# Altium footprint library CONNECTOR.PcbLib: 169 footprints (part 5 of 11)
Each footprint in its own frame and in the unit in brackets; x right, y up, seen from the top. Pads: shape width x height; smd on the part's side, far side on the other; paste and mask are expansions set on the pad; w line width, h text height; cw(c..) or ccw(c..) is an arc to the next point about the centre after c.
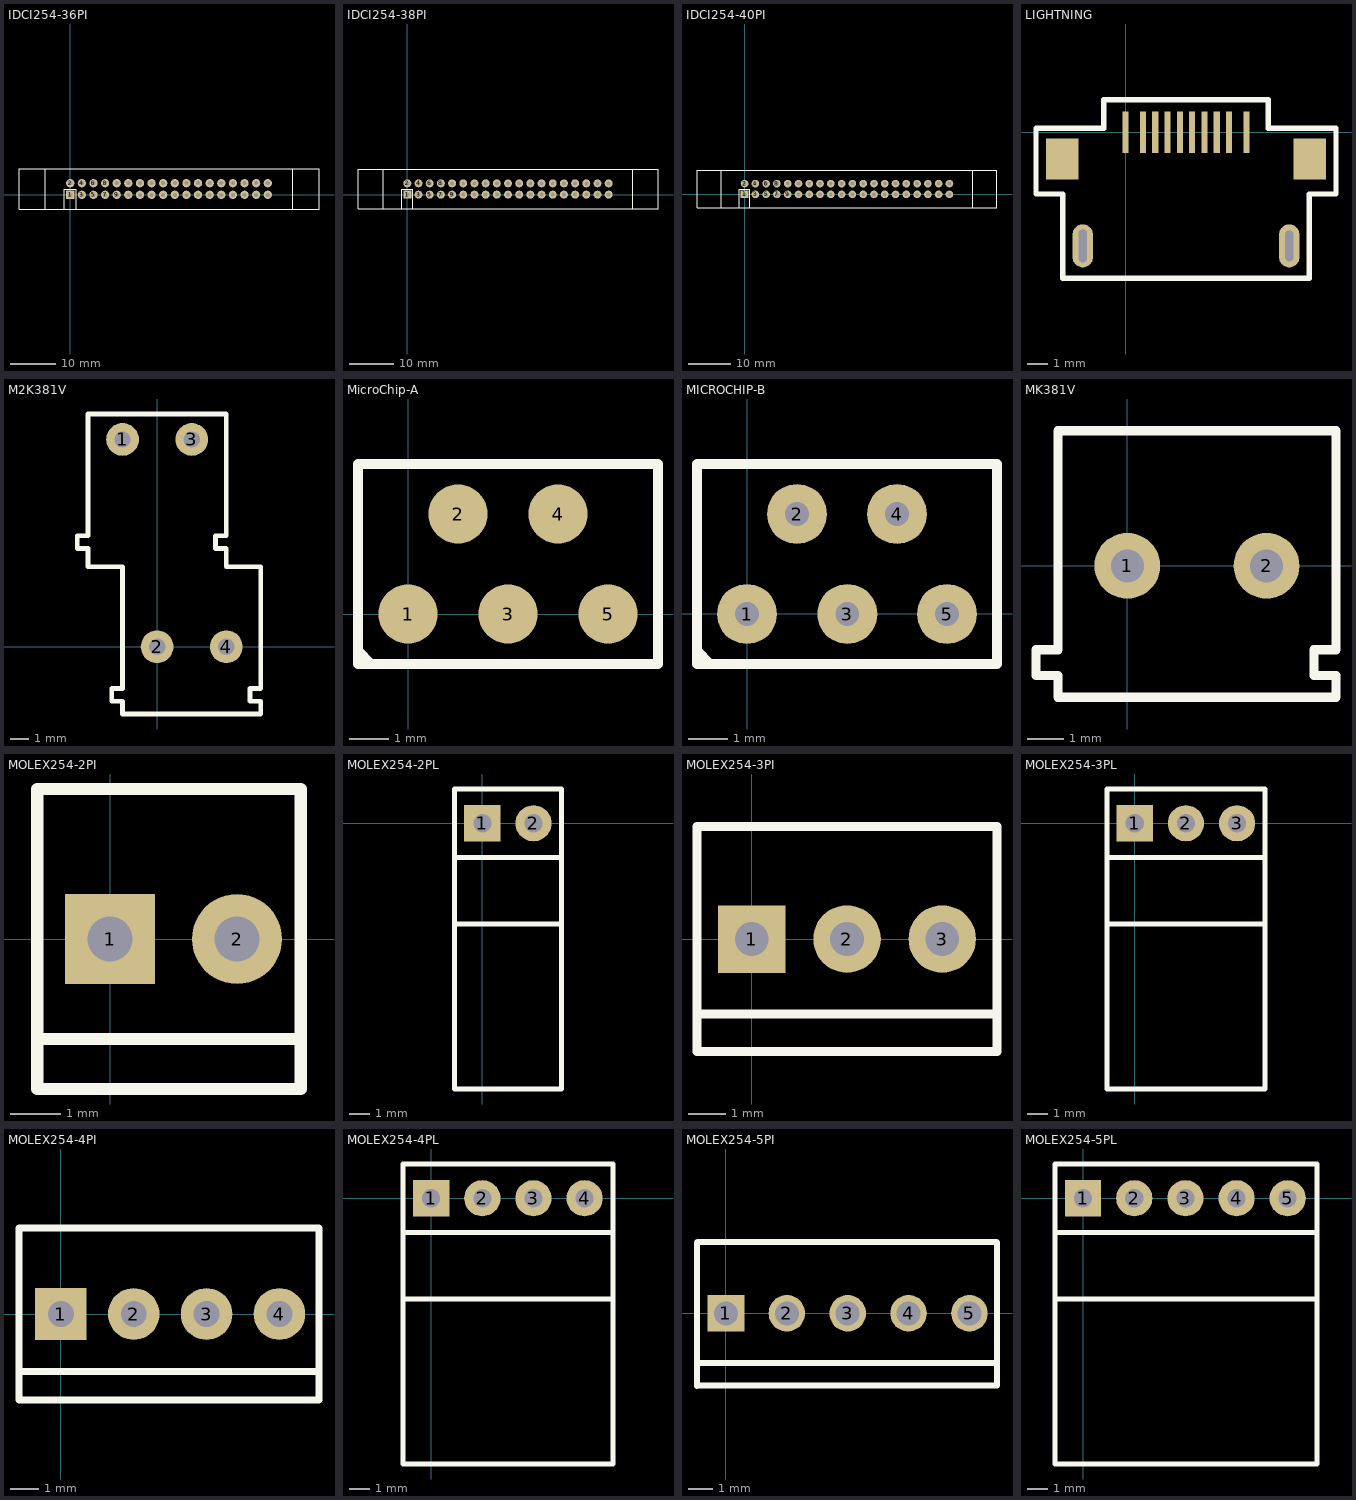
[diagram p4: the footprints below, top view; thin cyan lines are the x and y axes]

## IDCI254-36PI [mm]
pads (36):
  rect 1.8x1.8 hole 0.9: 1(0,0)
  round 1.8 hole 0.9: 2(0,2.54) 3(2.54,0) 4(2.54,2.54) 5(5.08,0) 6(5.08,2.54) 7(7.62,0) 8(7.62,2.54) 9(10.16,0) 10(10.16,2.54) 11(12.7,0) 12(12.7,2.54) 13(15.24,0) 14(15.24,2.54) 15(17.78,0) 16(17.78,2.54) 17(20.32,0) 18(20.32,2.54) 19(22.86,0) 20(22.86,2.54) 21(25.4,0) 22(25.4,2.54) 23(27.94,0) 24(27.94,2.54) 25(30.48,0) 26(30.48,2.54) 27(33.02,0) 28(33.02,2.54) 29(35.56,0) 30(35.56,2.54) 31(38.1,0) 32(38.1,2.54) 33(40.64,0) 34(40.64,2.54) 35(43.18,0) 36(43.18,2.54)
Top Overlay:
  lines w0.2: -5.5,-3.2 -5.5,5.74 ; -1.27,-3.2 -1.27,1.27 1.27,1.27 1.27,-3.2 ; 48.68,-3.2 48.68,5.74 ; -11.2,-3.2 54.38,-3.2 54.38,5.74 -11.2,5.74 -11.2,-3.2
3D body "1-1761685-3.stp": height 17.22, standoff -2.59, extent -10.776,-3.528 59.074,5.691

## IDCI254-38PI [mm]
pads (38):
  rect 1.8x1.8 hole 0.9: 1(0,0)
  round 1.8 hole 0.9: 2(0,2.54) 3(2.54,0) 4(2.54,2.54) 5(5.08,0) 6(5.08,2.54) 7(7.62,0) 8(7.62,2.54) 9(10.16,0) 10(10.16,2.54) 11(12.7,0) 12(12.7,2.54) 13(15.24,0) 14(15.24,2.54) 15(17.78,0) 16(17.78,2.54) 17(20.32,0) 18(20.32,2.54) 19(22.86,0) 20(22.86,2.54) 21(25.4,0) 22(25.4,2.54) 23(27.94,0) 24(27.94,2.54) 25(30.48,0) 26(30.48,2.54) 27(33.02,0) 28(33.02,2.54) 29(35.56,0) 30(35.56,2.54) 31(38.1,0) 32(38.1,2.54) 33(40.64,0) 34(40.64,2.54) 35(43.18,0) 36(43.18,2.54) 37(45.72,0) 38(45.72,2.54)
Top Overlay:
  lines w0.2: -5.5,-3.2 -5.5,5.74 ; -1.27,-3.2 -1.27,1.27 1.27,1.27 1.27,-3.2 ; 51.22,-3.2 51.22,5.74 ; -11.2,-3.2 56.92,-3.2 56.92,5.74 -11.2,5.74 -11.2,-3.2
3D body "1-1761685-3.stp": height 17.22, standoff -2.59, extent -10.776,-3.528 59.074,5.691

## IDCI254-40PI [mm]
pads (40):
  rect 1.8x1.8 hole 0.9: 1(0,0)
  round 1.8 hole 0.9: 2(0,2.54) 3(2.54,0) 4(2.54,2.54) 5(5.08,0) 6(5.08,2.54) 7(7.62,0) 8(7.62,2.54) 9(10.16,0) 10(10.16,2.54) 11(12.7,0) 12(12.7,2.54) 13(15.24,0) 14(15.24,2.54) 15(17.78,0) 16(17.78,2.54) 17(20.32,0) 18(20.32,2.54) 19(22.86,0) 20(22.86,2.54) 21(25.4,0) 22(25.4,2.54) 23(27.94,0) 24(27.94,2.54) 25(30.48,0) 26(30.48,2.54) 27(33.02,0) 28(33.02,2.54) 29(35.56,0) 30(35.56,2.54) 31(38.1,0) 32(38.1,2.54) 33(40.64,0) 34(40.64,2.54) 35(43.18,0) 36(43.18,2.54) 37(45.72,0) 38(45.72,2.54) 39(48.26,0) 40(48.26,2.54)
Top Overlay:
  lines w0.2: -5.5,-3.2 -5.5,5.74 ; -1.27,-3.2 -1.27,1.27 1.27,1.27 1.27,-3.2 ; 53.76,-3.2 53.76,5.74 ; -11.2,-3.2 -11.2,5.74 59.46,5.74 59.46,-3.2 -11.2,-3.2
3D body "1-1761685-3.stp": height 17.22, standoff -2.59, extent -10.776,-3.528 59.074,5.691

## LIGHTNING [mm]
pads (14):
  rect 0.3x2 smd: 1(-0.011,-0.002) 2(0.839,-0.002) 3(1.439,-0.002) 4(2.039,-0.002) 5(2.639,-0.002) 6(3.239,-0.002) 7(3.839,-0.002) 8(4.439,-0.002) 9(5.039,-0.002) 10(5.889,-0.002)
  rect 1.6x2 smd: ""(-3.086,-1.302) ""(8.964,-1.302)
  oval 1x2.1 hole 0.4 slot 1.6 at 90 deg: ""(-2.086,-5.532)
  oval 1x2.1 hole 0.4 slot 1.5 at 90 deg: ""(7.964,-5.532)
Top Overlay:
  lines w0.254: -3.062,-6.6 -3.062,-7.105 8.939,-7.105 8.939,-6.556 ; -3.061,-6.602 -3.061,-3.002 -4.361,-3.002 -4.361,0.198 -1.061,0.198 -1.061,1.579 6.939,1.579 6.939,0.185 ; 6.939,0.198 10.239,0.198 ; 8.939,-6.602 8.939,-3.002 10.239,-3.002 10.239,0.185

## M2K381V [mm]
height 16.4
pads (4):
  round 1.8 hole 0.9: 1(-1.9,11.4) 2(0,0) 3(1.91,11.4) 4(3.81,0)
Top Overlay:
  lines w0.254: 3.81,5.39 3.81,4.4 5.71,4.4 5.71,-2.3 5.11,-2.3 5.11,-3 5.71,-3 5.71,-3.7 -1.9,-3.7 -1.9,-3 -2.5,-3 -2.5,-2.3 -1.9,-2.3 -1.9,4.4 -3.8,4.4 -3.8,5.4 -4.4,5.4 -4.4,6.1 -3.8,6.1 -3.8,12.8 3.81,12.8 3.81,6.1 3.21,6.1 3.21,5.4 3.81,5.4

## MicroChip-A [mm]
pads (5):
  round 1.5 smd paste-0.8: 1(0,0) 2(1.27,2.54) 3(2.54,0) 4(3.81,2.54) 5(5.08,0)
Top Overlay:
  region: -1,-0.5
  region: -1.23,-0.66
  region: -1.27,-1.27
  region: -1.27,-1.27 -0.77,-1.27 -1.27,-0.77
  lines w0.254: -1.27,-1.27 6.35,-1.27 6.35,3.81 -1.27,3.81 -1.27,-1.27

## MICROCHIP-B [mil]
pads (5):
  round 60 / inner round 60 / far side round 35.43 hole 23.62 paste-39.37: 1(-0.01,-0.04) 2(49.99,99.96) 3(100.38,-0.04) 4(149.99,99.96) 5(199.99,-0.04)
Top Overlay:
  region: -50.01,-50.04 -30.33,-50.04 -50.01,-30.35
  lines w10: -50.01,-50.04 -50.01,149.96 249.99,149.96 249.99,-50.04 -50.01,-50.04

## MK381V [mm]
height 8.6
pads (2):
  round 1.8 hole 0.9: 1(0,0) 2(3.81,0)
Top Overlay:
  lines w0.254: -1.9,-3.6 5.71,-3.6 ; -1.9,-3.59 -1.9,-3 -2.5,-3 -2.5,-2.3 -1.9,-2.3 -1.9,3.7 5.71,3.7 5.71,-2.3 5.11,-2.3 5.11,-3 5.71,-3 5.71,-3.59

## MOLEX254-2PI [mm]
pads (2):
  rect 1.8x1.8 hole 0.9: 1(0,0)
  round 1.8 hole 0.9: 2(2.54,0)
Top Overlay:
  lines w0.25: -1.46,-2 3.815,-2 ; -1.46,-3 3.815,-3 3.815,3 -1.46,3 -1.46,-3
3D body "User Library-Molex 2 pines.STEP": height 11.6, standoff -3.1, extent -1.611,-3 4.139,3

## MOLEX254-2PL [mm]
pads (2):
  rect 1.8x1.8 hole 0.9: 1(0,0)
  round 1.8 hole 0.9: 2(2.54,0)
Top Overlay:
  lines w0.25: -1.39,-5 3.937,-5 ; -1.39,-1.7 3.937,-1.7 ; 3.937,-13.2 -1.39,-13.2 -1.39,1.7 3.937,1.7 ; 3.937,-13.198 3.937,1.702
3D body "22-05-7028.stp": height 5.87, standoff -3.77, extent -1.286,-14.435 3.794,0.303

## MOLEX254-3PI [mm]
pads (3):
  rect 1.8x1.8 hole 0.9: 1(0,0)
  round 1.8 hole 0.9: 2(2.54,0) 3(5.08,0)
Top Overlay:
  lines w0.25: -1.46,-2 6.54,-2 ; -1.46,-3 6.54,-3 6.54,3 -1.46,3 -1.46,-3
3D body "22-29-2031.stp": height 12.12, standoff -3.14, extent -1.28,-2.858 6.34,2.942

## MOLEX254-3PL [mm]
pads (3):
  rect 1.8x1.8 hole 0.9: 1(0,0)
  round 1.8 hole 0.9: 2(2.54,0) 3(5.08,0)
Top Overlay:
  lines w0.25: -1.39,-5 6.477,-5 ; -1.39,-1.7 6.477,-1.7 ; 6.477,-13.2 -1.39,-13.2 -1.39,1.7 6.477,1.7 ; 6.477,-13.198 6.477,1.702
3D body "4242.stp": height 6.17, standoff -3.76, extent -1.242,-12.536 6.378,0.291

## MOLEX254-4PI [mm]
pads (4):
  rect 1.8x1.8 hole 0.9: 1(0,0)
  round 1.8 hole 0.9: 2(2.54,0) 3(5.08,0) 4(7.62,0)
Top Overlay:
  lines w0.25: -1.46,-2 9,-2 ; -1.46,-3 -1.46,3 9,3 9,-3 -1.46,-3
3D body "22-29-2041.stp": height 12.12, standoff -3.14, extent -1.243,-2.899 8.917,2.901

## MOLEX254-4PL [mm]
pads (4):
  rect 1.8x1.8 hole 0.9: 1(0,0)
  round 1.8 hole 0.9: 2(2.54,0) 3(5.08,0) 4(7.62,0)
Top Overlay:
  lines w0.25: -1.39,-5 9.02,-5 ; -1.39,-1.7 9.02,-1.7 ; -1.39,-13.2 9.02,-13.2 9.02,1.7 -1.39,1.7 -1.39,-13.2
3D body "4308.stp": height 5.87, standoff -3.77, extent -1.273,-14.407 8.887,0.331

## MOLEX254-5PI [mil]
pads (5):
  rect 60x60 hole 39.37: 1(0,0)
  round 60 hole 39.37: 2(100,0) 3(200,0) 4(300,0) 5(400,0)
Top Overlay:
  lines w10: -47.64,-119.29 -47.64,116.14 -46.85,116.93 444.49,116.93 445.28,116.14 445.28,-118.9 -47.64,-118.9 -47.64,-81.48 444.88,-81.48
3D body "User Library-Molex 5 pines.STEP": height 452.76, standoff -125.99, extent -47.64,-119.29 445.27,116.93

## MOLEX254-5PL [mm]
pads (5):
  rect 1.8x1.8 hole 0.9: 1(0,0)
  round 1.8 hole 0.9: 2(2.54,0) 3(5.08,0) 4(7.62,0) 5(10.16,0)
Top Overlay:
  lines w0.25: -1.39,-5 11.61,-5 ; -1.39,-1.7 11.61,-1.7 ; -1.39,-13.2 11.61,-13.2 11.61,1.7 -1.39,1.7 -1.39,-13.2
3D body "4309.stp": height 5.87, standoff -3.77, extent -1.285,-14.418 11.415,0.319